# Altium footprint library 7-Connectors-9.PcbLib: 41 footprints (part 1 of 3)
Each footprint in its own frame and in the unit in brackets; x right, y up, seen from the top. Pads: shape width x height; smd on the part's side, far side on the other; paste and mask are expansions set on the pad; w line width, h text height; cw(c..) or ccw(c..) is an arc to the next point about the centre after c.
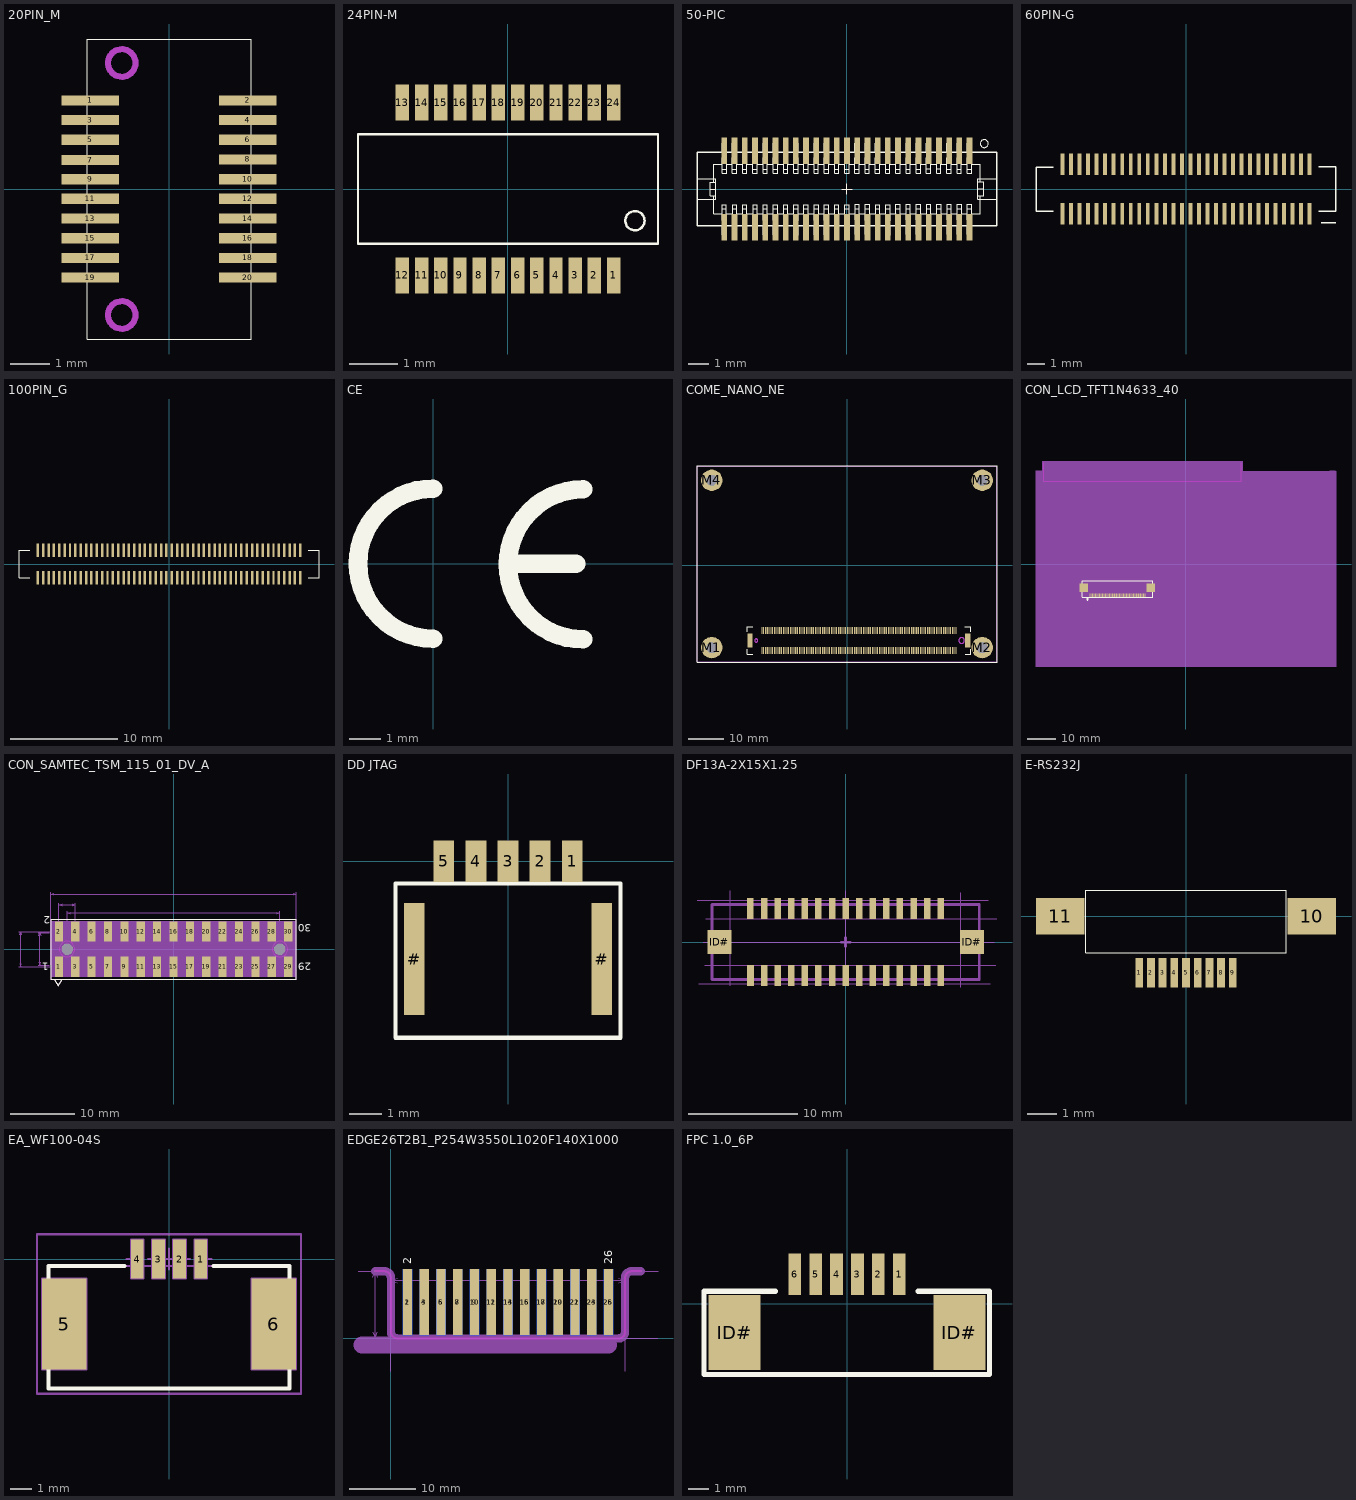
[diagram p0: the footprints below, top view; thin cyan lines are the x and y axes]

## 20PIN_M [mm]
height 6.72
pads (20):
  rect 1.45x0.26 smd: 1(-2,2.25) 2(2,2.25) 3(-2,1.75) 4(2,1.75) 5(-2,1.25) 6(2,1.25) 7(-2,0.737) 8(2,0.75) 9(-2,0.25) 10(2,0.25) 11(-2,-0.25) 12(2,-0.25) 13(-2,-0.75) 14(2,-0.75) 15(-2,-1.25) 16(2,-1.25) 17(-2,-1.75) 18(2,-1.75) 19(-2,-2.25) 20(2,-2.25)
Top Overlay:
  lines w0.025: -2.083,-3.81 2.083,-3.81 2.083,3.81 -2.083,3.81 -2.083,-3.81
Keep-Out Layer:
  circle w0.152: c-1.2,3.2 r0.35
  circle w0.152: c-1.2,-3.2 r0.35
Mechanical 1:
  circle w0.152: c-1.2,3.2 r0.35
  circle w0.152: c-1.2,-3.2 r0.35
3D body "20pin.stp": height 3.5, standoff -0.01, extent -2.88,-3.81 2.88,3.81

## 24PIN-M [mm]
height 6.72
pads (24):
  rect 0.28x0.75 smd: 1(2.2,-1.8) 2(1.8,-1.8) 3(1.4,-1.8) 4(1,-1.8) 5(0.6,-1.8) 6(0.2,-1.8) 7(-0.2,-1.8) 8(-0.6,-1.8) 9(-1,-1.8) 10(-1.4,-1.8) 11(-1.8,-1.8) 12(-2.2,-1.8) 13(-2.2,1.8) 14(-1.8,1.8) 15(-1.4,1.8) 16(-1,1.8) 17(-0.6,1.8) 18(-0.2,1.8) 19(0.2,1.8) 20(0.6,1.8) 21(1,1.8) 22(1.4,1.8) 23(1.8,1.8) 24(2.2,1.8)
Top Overlay:
  circle w0.051: c2.644,-0.66 r0.201
  lines w0.051: -3.124,-1.143 -3.124,1.143 3.124,1.143 3.124,-1.143 -3.124,-1.143

## 50-PIC [mil]
height 264.57
pads (50):
  rect 11x51 smd mask+2: 1(236.22,73.5) 2(216.54,73.5) 3(196.85,73.5) 4(177.17,73.5) 5(157.48,73.5) 6(137.8,73.5) 7(118.11,73.5) 8(98.43,73.5) 9(78.74,73.5) 10(59.06,73.5) 11(39.37,73.5) 12(19.69,73.5) 13(0,73.5) 14(-19.68,73.5) 15(-39.37,73.5) 16(-59.05,73.5) 17(-78.74,73.5) 18(-98.42,73.5) 19(-118.11,73.5) 20(-137.79,73.5) 21(-157.48,73.5) 22(-177.16,73.5) 23(-196.85,73.5) 24(-216.53,73.5) 25(-236.22,73.5) 26(-236.22,-73.5) 27(-216.53,-73.5) 28(-196.85,-73.5) 29(-177.16,-73.5) 30(-157.48,-73.5) 31(-137.79,-73.5) 32(-118.11,-73.5) 33(-98.42,-73.5) 34(-78.74,-73.5) 35(-59.05,-73.5) 36(-39.37,-73.5) 37(-19.68,-73.5) 38(0,-73.5) 39(19.69,-73.5) 40(39.37,-73.5) 41(59.06,-73.5) 42(78.74,-73.5) 43(98.43,-73.5) 44(118.11,-73.5) 45(137.8,-73.5) 46(157.48,-73.5) 47(177.17,-73.5) 48(196.85,-73.5) 49(216.54,-73.5) 50(236.22,-73.5)
Top Overlay:
  drawing of 491 lines, arcs and shapes, not listed

## 60PIN-G [mil]
height 264.57
pads (60):
  rect 9x50 smd mask+2: 1(285.43,-57.5) 2(265.75,-57.5) 3(246.06,-57.5) 4(226.38,-57.5) 5(206.69,-57.5) 6(187.01,-57.5) 7(167.32,-57.5) 8(147.64,-57.5) 9(127.95,-57.5) 10(108.27,-57.5) 11(88.58,-57.5) 12(68.9,-57.5) 13(49.21,-57.5) 14(29.53,-57.5) 15(9.84,-57.5) 16(-9.84,-57.5) 17(-29.53,-57.5) 18(-49.21,-57.5) 19(-68.9,-57.5) 20(-88.58,-57.5) 21(-108.27,-57.5) 22(-127.95,-57.5) 23(-147.64,-57.5) 24(-167.32,-57.5) 25(-187.01,-57.5) 26(-206.69,-57.5) 27(-226.38,-57.5) 28(-246.06,-57.5) 29(-265.75,-57.5) 30(-285.43,-57.5) 31(-285.43,57.5) 32(-265.75,57.5) 33(-246.06,57.5) 34(-226.38,57.5) 35(-206.69,57.5) 36(-187.01,57.5) 37(-167.32,57.5) 38(-147.64,57.5) 39(-127.95,57.5) 40(-108.27,57.5) 41(-88.58,57.5) 42(-68.9,57.5) 43(-49.21,57.5) 44(-29.53,57.5) 45(-9.84,57.5) 46(9.84,57.5) 47(29.53,57.35) 48(49.21,57.35) 49(68.9,57.5) 50(88.58,57.5) 51(108.27,57.5) 52(127.95,57.5) 53(147.64,57.5) 54(167.32,57.5) 55(187.01,57.5) 56(206.69,57.5) 57(226.38,57.5) 58(246.06,57.5) 59(265.75,57.5) 60(285.43,57.5)
Top Overlay:
  lines w3: -346.81,-51.85 -346.81,50.51 ; -346.54,-51.85 -307.17,-51.85 ; -346.57,50.51 -307.2,50.51 ; 306.61,-51.14 346.22,-51.14 346.22,51.22 306.61,51.22 ; 311.73,-78.11 346.02,-78.11

## 100PIN_G [mm]
height 6.72
pads (100):
  rect 0.229x1.27 smd mask+0.051: 1(12.25,-1.3) 2(11.75,-1.3) 3(11.25,-1.3) 4(10.75,-1.3) 5(10.25,-1.3) 6(9.75,-1.3) 7(9.25,-1.3) 8(8.75,-1.3) 9(8.25,-1.3) 10(7.75,-1.3) 11(7.25,-1.3) 12(6.75,-1.3) 13(6.25,-1.3) 14(5.75,-1.3) 15(5.25,-1.3) 16(4.75,-1.3) 17(4.25,-1.3) 18(3.75,-1.3) 19(3.25,-1.3) 20(2.75,-1.3) 21(2.25,-1.3) 22(1.75,-1.3) 23(1.25,-1.3) 24(0.75,-1.3) 25(0.25,-1.3) 26(-0.25,-1.3) 27(-0.75,-1.3) 28(-1.25,-1.3) 29(-1.75,-1.3) 30(-2.25,-1.3) 31(-2.75,-1.3) 32(-3.25,-1.3) 33(-3.75,-1.3) 34(-4.25,-1.3) 35(-4.75,-1.3) 36(-5.25,-1.3) 37(-5.75,-1.3) 38(-6.25,-1.3) 39(-6.75,-1.3) 40(-7.25,-1.3) 41(-7.75,-1.3) 42(-8.25,-1.3) 43(-8.75,-1.3) 44(-9.25,-1.3) 45(-9.75,-1.3) 46(-10.25,-1.3) 47(-10.75,-1.3) 48(-11.25,-1.3) 49(-11.75,-1.3) 50(-12.25,-1.3) 51(-12.25,1.3) 52(-11.75,1.3) 53(-11.25,1.3) 54(-10.75,1.3) 55(-10.25,1.3) 56(-9.75,1.3) 57(-9.25,1.3) 58(-8.75,1.3) 59(-8.25,1.3) 60(-7.75,1.3) 61(-7.25,1.3) 62(-6.75,1.3) 63(-6.25,1.3) 64(-5.75,1.3) 65(-5.25,1.3) 66(-4.75,1.3) 67(-4.25,1.3) 68(-3.75,1.3) 69(-3.25,1.3) 70(-2.75,1.3) 71(-2.25,1.3) 72(-1.75,1.3) 73(-1.25,1.3) 74(-0.75,1.3) 75(-0.25,1.3) 76(0.25,1.3) 77(0.75,1.3) 78(1.25,1.3) 79(1.75,1.3) 80(2.25,1.3) 81(2.775,1.3) 82(3.25,1.3) 83(3.75,1.3) 84(4.25,1.3) 85(4.75,1.3) 86(5.25,1.3) 87(5.75,1.3) 88(6.25,1.3) 89(6.75,1.3) 90(7.25,1.3) 91(7.75,1.3) 92(8.25,1.3) 93(8.75,1.3) 94(9.25,1.3) 95(9.75,1.3) 96(10.25,1.3) 97(10.75,1.3) 98(11.25,1.3) 99(11.75,1.3) 100(12.25,1.3)
Top Overlay:
  lines w0.076: -14.011,1.298 -13.011,1.298 ; -14,1.3 -14,-1.3 -13,-1.3 ; 13,-1.3 14,-1.3 14,1.3 13,1.3

## CE [mm]
Top Overlay:
  lines w0.6: 0,-2.413 cw(c0,0) 0,2.413 ; 2.53,0 4.6,0 ; 4.826,-2.438 cw(c4.826,-0.025) 4.826,2.388
3D body "ce.stp": height 0.02, standoff 0, extent -2.725,-2.725 4.82,2.725

## COME_NANO_NE [mm]
height 11
pads (226):
  rect 0.3x2 smd mask+0.07: A1(-23.897,-23.899) A2(-23.397,-23.899) A3(-22.897,-23.899) A4(-22.397,-23.899) A5(-21.897,-23.899) A6(-21.397,-23.899) A7(-20.897,-23.899) A8(-20.397,-23.899) A9(-19.897,-23.899) A10(-19.397,-23.899) A11(-18.897,-23.899) A12(-18.397,-23.899) A13(-17.897,-23.899) A14(-17.397,-23.899) A15(-16.897,-23.899) A16(-16.397,-23.899) A17(-15.897,-23.899) A18(-15.397,-23.899) A19(-14.897,-23.899) A20(-14.397,-23.899) A21(-13.897,-23.899) A22(-13.397,-23.899) A23(-12.897,-23.899) A24(-12.397,-23.899) A25(-11.897,-23.899) A26(-11.397,-23.899) A27(-10.897,-23.899) A28(-10.397,-23.899) A29(-9.897,-23.899) A30(-9.397,-23.899) A31(-8.897,-23.899) A32(-8.397,-23.899) A33(-7.897,-23.899) A34(-7.397,-23.899) A35(-6.897,-23.899) A36(-6.397,-23.899) A37(-5.897,-23.899) A38(-5.397,-23.899) A39(-4.897,-23.899) A40(-4.397,-23.899) A41(-3.897,-23.899) A42(-3.397,-23.899) A43(-2.897,-23.899) A44(-2.397,-23.899) A45(-1.897,-23.899) A46(-1.397,-23.899) A47(-0.897,-23.899) A48(-0.397,-23.899) A49(0.103,-23.899) A50(0.603,-23.899) A51(1.103,-23.899) A52(1.603,-23.899) A53(2.103,-23.899) A54(2.603,-23.899) A55(3.103,-23.899) A56(3.603,-23.899) A57(4.103,-23.899) A58(4.603,-23.899) A59(5.103,-23.899) A60(5.603,-23.899) A61(6.103,-23.899) A62(6.603,-23.899) A63(7.103,-23.899) A64(7.603,-23.899) A65(8.103,-23.899) A66(8.603,-23.899) A67(9.103,-23.899) A68(9.603,-23.899) A69(10.103,-23.899) A70(10.603,-23.899) A71(11.103,-23.899) A72(11.603,-23.899) A73(12.103,-23.899) A74(12.603,-23.899) A75(13.103,-23.899) A76(13.603,-23.899) A77(14.103,-23.899) A78(14.603,-23.899) A79(15.103,-23.899) A80(15.603,-23.899) A81(16.103,-23.899) A82(16.603,-23.899) A83(17.103,-23.899) A84(17.603,-23.899) A85(18.103,-23.899) A86(18.603,-23.899) A87(19.103,-23.899) A88(19.603,-23.899) A89(20.103,-23.899) A90(20.603,-23.899) A91(21.103,-23.899) A92(21.603,-23.899) A93(22.103,-23.899) A94(22.603,-23.899) A95(23.103,-23.899) A96(23.603,-23.899) A97(24.103,-23.899) A98(24.603,-23.899) A99(25.103,-23.899) A100(25.603,-23.899) A101(26.103,-23.899) A102(26.603,-23.899) A103(27.103,-23.899) A104(27.603,-23.899) A105(28.103,-23.899) A106(28.603,-23.899) A107(29.103,-23.899) A108(29.603,-23.899) A109(30.103,-23.899) A110(30.603,-23.899) B1(-23.897,-18.3) B2(-23.397,-18.3) B3(-22.897,-18.3) B4(-22.397,-18.3) B5(-21.897,-18.3) B6(-21.397,-18.3) B7(-20.897,-18.3) B8(-20.397,-18.3) B9(-19.897,-18.3) B10(-19.397,-18.3) B11(-18.897,-18.3) B12(-18.397,-18.3) B13(-17.897,-18.3) B14(-17.397,-18.3) B15(-16.897,-18.3) B16(-16.397,-18.3) B17(-15.897,-18.3) B18(-15.397,-18.3) B19(-14.897,-18.3) B20(-14.397,-18.3) B21(-13.897,-18.3) B22(-13.397,-18.3) B23(-12.897,-18.3) B24(-12.397,-18.3) B25(-11.897,-18.3) B26(-11.397,-18.3) B27(-10.897,-18.3) B28(-10.397,-18.3) B29(-9.897,-18.3) B30(-9.397,-18.3) B31(-8.897,-18.3) B32(-8.397,-18.3) B33(-7.897,-18.3) B34(-7.397,-18.3) B35(-6.897,-18.3) B36(-6.397,-18.3) B37(-5.897,-18.3) B38(-5.397,-18.3) B39(-4.897,-18.3) B40(-4.397,-18.3) B41(-3.897,-18.3) B42(-3.397,-18.3) B43(-2.897,-18.3) B44(-2.397,-18.3) B45(-1.897,-18.3) B46(-1.397,-18.3) B47(-0.897,-18.3) B48(-0.397,-18.3) B49(0.103,-18.3) B50(0.603,-18.3) B51(1.103,-18.3) B52(1.603,-18.3) B53(2.103,-18.3) B54(2.603,-18.3) B55(3.103,-18.3) B56(3.603,-18.3) B57(4.103,-18.3) B58(4.603,-18.3) B59(5.103,-18.3) B60(5.603,-18.3) B61(6.103,-18.3) B62(6.603,-18.3) B63(7.103,-18.3) B64(7.603,-18.3) B65(8.103,-18.3) B66(8.603,-18.3) B67(9.103,-18.3) B68(9.603,-18.3) B69(10.103,-18.3) B70(10.603,-18.3) B71(11.103,-18.3) B72(11.603,-18.3) B73(12.103,-18.3) B74(12.603,-18.3) B75(13.103,-18.3) B76(13.603,-18.3) B77(14.103,-18.3) B78(14.603,-18.3) B79(15.103,-18.3) B80(15.603,-18.3) B81(16.103,-18.3) B82(16.603,-18.3) B83(17.103,-18.3) B84(17.603,-18.3) B85(18.103,-18.3) B86(18.603,-18.3) B87(19.103,-18.3) B88(19.603,-18.3) B89(20.103,-18.3) B90(20.603,-18.3) B91(21.103,-18.3) B92(21.603,-18.3) B93(22.103,-18.3) B94(22.603,-18.3) B95(23.103,-18.3) B96(23.603,-18.3) B97(24.103,-18.3) B98(24.603,-18.3) B100(25.603,-18.3) B101(26.103,-18.3) B102(26.603,-18.3) B103(27.103,-18.3) B104(27.603,-18.3) B105(28.103,-18.3) B106(28.603,-18.3) B107(29.103,-18.3) B108(29.603,-18.3) B109(30.103,-18.3) B110(30.603,-18.3)
  rect 0.3x2 smd: B99(25.103,-18.3)
  round 6 hole 3 mask+0.07: M1(-38,-23.101) M2(38,-23.101) M3(38,23.899) M4(-38,23.899)
  rect 1.5x4 smd mask+0.07: P1(-27.25,-21.101) P2(33.95,-21.101)
Top Overlay:
  lines w0.03: -42.139,-27.254 -42.139,28.042 42.139,28.042 42.139,-27.254 -42.139,-27.254
  lines w0.254: -28,-23.6 -28,-24.901 -26.5,-24.901 ; -28,-18.6 -28,-17.326 -27.975,-17.301 -26.5,-17.301 ; 33.2,-24.901 34.7,-24.901 34.7,-23.6 ; 33.2,-17.326 33.225,-17.301 34.7,-17.301 34.7,-18.6
Keep-Out Layer:
  circle w0.1: c32.203,-21.099 r0.8
  circle w0.1: c-25.5,-21.101 r0.45
Mechanical 1:
  circle w0.1: c32.203,-21.099 r0.8
  circle w0.1: c-25.5,-21.101 r0.45
Mechanical 15:
  lines w0.203: -42,-27.101 42,-27.101 42,27.899 -42,27.899 -42,-27.101
3D body "come220z.stp": height 4.45, standoff -0.6, extent -27.547,-24.283 34.253,-18.083
3D body "03-2.stp": height 0.02, standoff 0, extent -24.047,-24.899 -23.747,-22.899
3D body "03-2.stp": height 0.02, standoff 0, extent -23.547,-24.899 -23.247,-22.899
3D body "03-2.stp": height 0.02, standoff 0, extent -23.047,-24.899 -22.747,-22.899
3D body "03-2.stp": height 0.02, standoff 0, extent -22.547,-24.899 -22.247,-22.899
3D body "03-2.stp": height 0.02, standoff 0, extent -22.047,-24.899 -21.747,-22.899
3D body "03-2.stp": height 0.02, standoff 0, extent -21.547,-24.899 -21.247,-22.899
3D body "03-2.stp": height 0.02, standoff 0, extent -21.047,-24.899 -20.747,-22.899
3D body "03-2.stp": height 0.02, standoff 0, extent -20.547,-24.899 -20.247,-22.899
3D body "03-2.stp": height 0.02, standoff 0, extent -20.047,-24.899 -19.747,-22.899
3D body "03-2.stp": height 0.02, standoff 0, extent -19.547,-24.899 -19.247,-22.899
3D body "03-2.stp": height 0.02, standoff 0, extent -19.047,-24.899 -18.747,-22.899
3D body "03-2.stp": height 0.02, standoff 0, extent -18.547,-24.899 -18.247,-22.899
3D body "03-2.stp": height 0.02, standoff 0, extent -18.047,-24.899 -17.747,-22.899
3D body "03-2.stp": height 0.02, standoff 0, extent -17.547,-24.899 -17.247,-22.899
3D body "03-2.stp": height 0.02, standoff 0, extent -17.047,-24.899 -16.747,-22.899
3D body "03-2.stp": height 0.02, standoff 0, extent -16.547,-24.899 -16.247,-22.899
3D body "03-2.stp": height 0.02, standoff 0, extent -16.047,-24.899 -15.747,-22.899
3D body "03-2.stp": height 0.02, standoff 0, extent -15.547,-24.899 -15.247,-22.899
3D body "03-2.stp": height 0.02, standoff 0, extent -15.047,-24.899 -14.747,-22.899
3D body "03-2.stp": height 0.02, standoff 0, extent -14.547,-24.899 -14.247,-22.899
3D body "03-2.stp": height 0.02, standoff 0, extent -14.047,-24.899 -13.747,-22.899
3D body "03-2.stp": height 0.02, standoff 0, extent -13.547,-24.899 -13.247,-22.899
3D body "03-2.stp": height 0.02, standoff 0, extent -13.047,-24.899 -12.747,-22.899
3D body "03-2.stp": height 0.02, standoff 0, extent -12.547,-24.899 -12.247,-22.899
3D body "03-2.stp": height 0.02, standoff 0, extent -12.047,-24.899 -11.747,-22.899
3D body "03-2.stp": height 0.02, standoff 0, extent -11.547,-24.899 -11.247,-22.899
3D body "03-2.stp": height 0.02, standoff 0, extent -11.047,-24.899 -10.747,-22.899
3D body "03-2.stp": height 0.02, standoff 0, extent -10.547,-24.899 -10.247,-22.899
3D body "03-2.stp": height 0.02, standoff 0, extent -10.047,-24.899 -9.747,-22.899
3D body "03-2.stp": height 0.02, standoff 0, extent -9.547,-24.899 -9.247,-22.899
3D body "03-2.stp": height 0.02, standoff 0, extent -9.047,-24.899 -8.747,-22.899
3D body "03-2.stp": height 0.02, standoff 0, extent -8.547,-24.899 -8.247,-22.899
3D body "03-2.stp": height 0.02, standoff 0, extent -8.047,-24.899 -7.747,-22.899
3D body "03-2.stp": height 0.02, standoff 0, extent -7.547,-24.899 -7.247,-22.899
3D body "03-2.stp": height 0.02, standoff 0, extent -7.047,-24.899 -6.747,-22.899
3D body "03-2.stp": height 0.02, standoff 0, extent -6.547,-24.899 -6.247,-22.899
3D body "03-2.stp": height 0.02, standoff 0, extent -6.047,-24.899 -5.747,-22.899
3D body "03-2.stp": height 0.02, standoff 0, extent -5.547,-24.899 -5.247,-22.899
3D body "03-2.stp": height 0.02, standoff 0, extent -5.047,-24.899 -4.747,-22.899
3D body "03-2.stp": height 0.02, standoff 0, extent -4.547,-24.899 -4.247,-22.899
3D body "03-2.stp": height 0.02, standoff 0, extent -4.047,-24.899 -3.747,-22.899
3D body "03-2.stp": height 0.02, standoff 0, extent -3.547,-24.899 -3.247,-22.899
3D body "03-2.stp": height 0.02, standoff 0, extent -3.047,-24.899 -2.747,-22.899
3D body "03-2.stp": height 0.02, standoff 0, extent -2.547,-24.899 -2.247,-22.899
3D body "03-2.stp": height 0.02, standoff 0, extent -2.047,-24.899 -1.747,-22.899
3D body "03-2.stp": height 0.02, standoff 0, extent -1.547,-24.899 -1.247,-22.899
3D body "03-2.stp": height 0.02, standoff 0, extent -1.047,-24.899 -0.747,-22.899
3D body "03-2.stp": height 0.02, standoff 0, extent -0.547,-24.899 -0.247,-22.899
3D body "03-2.stp": height 0.02, standoff 0, extent -0.047,-24.899 0.253,-22.899
3D body "03-2.stp": height 0.02, standoff 0, extent 0.453,-24.899 0.753,-22.899
3D body "03-2.stp": height 0.02, standoff 0, extent 0.953,-24.899 1.253,-22.899
3D body "03-2.stp": height 0.02, standoff 0, extent 1.453,-24.899 1.753,-22.899
3D body "03-2.stp": height 0.02, standoff 0, extent 1.953,-24.899 2.253,-22.899
3D body "03-2.stp": height 0.02, standoff 0, extent 2.453,-24.899 2.753,-22.899
3D body "03-2.stp": height 0.02, standoff 0, extent 2.953,-24.899 3.253,-22.899
3D body "03-2.stp": height 0.02, standoff 0, extent 3.453,-24.899 3.753,-22.899
3D body "03-2.stp": height 0.02, standoff 0, extent 3.953,-24.899 4.253,-22.899
3D body "03-2.stp": height 0.02, standoff 0, extent 4.453,-24.899 4.753,-22.899
3D body "03-2.stp": height 0.02, standoff 0, extent 4.953,-24.899 5.253,-22.899
3D body "03-2.stp": height 0.02, standoff 0, extent 5.453,-24.899 5.753,-22.899
3D body "03-2.stp": height 0.02, standoff 0, extent 5.953,-24.899 6.253,-22.899
3D body "03-2.stp": height 0.02, standoff 0, extent 6.453,-24.899 6.753,-22.899
3D body "03-2.stp": height 0.02, standoff 0, extent 6.953,-24.899 7.253,-22.899
3D body "03-2.stp": height 0.02, standoff 0, extent 7.453,-24.899 7.753,-22.899
3D body "03-2.stp": height 0.02, standoff 0, extent 7.953,-24.899 8.253,-22.899
3D body "03-2.stp": height 0.02, standoff 0, extent 8.453,-24.899 8.753,-22.899
3D body "03-2.stp": height 0.02, standoff 0, extent 8.953,-24.899 9.253,-22.899
3D body "03-2.stp": height 0.02, standoff 0, extent 9.453,-24.899 9.753,-22.899
3D body "03-2.stp": height 0.02, standoff 0, extent 9.953,-24.899 10.253,-22.899
3D body "03-2.stp": height 0.02, standoff 0, extent 10.453,-24.899 10.753,-22.899
3D body "03-2.stp": height 0.02, standoff 0, extent 10.953,-24.899 11.253,-22.899
3D body "03-2.stp": height 0.02, standoff 0, extent 11.453,-24.899 11.753,-22.899
3D body "03-2.stp": height 0.02, standoff 0, extent 11.953,-24.899 12.253,-22.899
3D body "03-2.stp": height 0.02, standoff 0, extent 12.453,-24.899 12.753,-22.899
3D body "03-2.stp": height 0.02, standoff 0, extent 12.953,-24.899 13.253,-22.899
3D body "03-2.stp": height 0.02, standoff 0, extent 13.453,-24.899 13.753,-22.899
3D body "03-2.stp": height 0.02, standoff 0, extent 13.953,-24.899 14.253,-22.899
3D body "03-2.stp": height 0.02, standoff 0, extent 14.453,-24.899 14.753,-22.899
3D body "03-2.stp": height 0.02, standoff 0, extent 14.953,-24.899 15.253,-22.899
3D body "03-2.stp": height 0.02, standoff 0, extent 15.453,-24.899 15.753,-22.899
3D body "03-2.stp": height 0.02, standoff 0, extent 15.953,-24.899 16.253,-22.899
3D body "03-2.stp": height 0.02, standoff 0, extent 16.453,-24.899 16.753,-22.899
3D body "03-2.stp": height 0.02, standoff 0, extent 16.953,-24.899 17.253,-22.899
3D body "03-2.stp": height 0.02, standoff 0, extent 17.453,-24.899 17.753,-22.899
3D body "03-2.stp": height 0.02, standoff 0, extent 17.953,-24.899 18.253,-22.899
3D body "03-2.stp": height 0.02, standoff 0, extent 18.453,-24.899 18.753,-22.899
3D body "03-2.stp": height 0.02, standoff 0, extent 18.953,-24.899 19.253,-22.899
3D body "03-2.stp": height 0.02, standoff 0, extent 19.453,-24.899 19.753,-22.899
3D body "03-2.stp": height 0.02, standoff 0, extent 19.953,-24.899 20.253,-22.899
3D body "03-2.stp": height 0.02, standoff 0, extent 20.453,-24.899 20.753,-22.899
3D body "03-2.stp": height 0.02, standoff 0, extent 20.953,-24.899 21.253,-22.899
3D body "03-2.stp": height 0.02, standoff 0, extent 21.453,-24.899 21.753,-22.899
3D body "03-2.stp": height 0.02, standoff 0, extent 21.953,-24.899 22.253,-22.899
3D body "03-2.stp": height 0.02, standoff 0, extent 22.453,-24.899 22.753,-22.899
3D body "03-2.stp": height 0.02, standoff 0, extent 22.953,-24.899 23.253,-22.899
3D body "03-2.stp": height 0.02, standoff 0, extent 23.453,-24.899 23.753,-22.899
3D body "03-2.stp": height 0.02, standoff 0, extent 23.953,-24.899 24.253,-22.899
3D body "03-2.stp": height 0.02, standoff 0, extent 24.453,-24.899 24.753,-22.899
3D body "03-2.stp": height 0.02, standoff 0, extent 24.953,-24.899 25.253,-22.899
3D body "03-2.stp": height 0.02, standoff 0, extent 25.453,-24.899 25.753,-22.899
3D body "03-2.stp": height 0.02, standoff 0, extent 25.953,-24.899 26.253,-22.899
3D body "03-2.stp": height 0.02, standoff 0, extent 26.453,-24.899 26.753,-22.899
3D body "03-2.stp": height 0.02, standoff 0, extent 26.953,-24.899 27.253,-22.899
3D body "03-2.stp": height 0.02, standoff 0, extent 27.453,-24.899 27.753,-22.899
3D body "03-2.stp": height 0.02, standoff 0, extent 27.953,-24.899 28.253,-22.899
3D body "03-2.stp": height 0.02, standoff 0, extent 28.453,-24.899 28.753,-22.899
3D body "03-2.stp": height 0.02, standoff 0, extent 28.953,-24.899 29.253,-22.899
3D body "03-2.stp": height 0.02, standoff 0, extent 29.453,-24.899 29.753,-22.899
3D body "03-2.stp": height 0.02, standoff 0, extent 29.953,-24.899 30.253,-22.899
3D body "03-2.stp": height 0.02, standoff 0, extent 30.453,-24.899 30.753,-22.899
3D body "03-2.stp": height 0.02, standoff 0, extent 30.453,-19.299 30.753,-17.299
3D body "03-2.stp": height 0.02, standoff 0, extent 29.953,-19.299 30.253,-17.299
3D body "03-2.stp": height 0.02, standoff 0, extent 29.453,-19.299 29.753,-17.299
3D body "03-2.stp": height 0.02, standoff 0, extent 28.953,-19.299 29.253,-17.299
3D body "03-2.stp": height 0.02, standoff 0, extent 28.453,-19.299 28.753,-17.299
3D body "03-2.stp": height 0.02, standoff 0, extent 27.953,-19.299 28.253,-17.299
3D body "03-2.stp": height 0.02, standoff 0, extent 27.453,-19.299 27.753,-17.299
3D body "03-2.stp": height 0.02, standoff 0, extent 26.953,-19.299 27.253,-17.299
3D body "03-2.stp": height 0.02, standoff 0, extent 26.453,-19.299 26.753,-17.299
3D body "03-2.stp": height 0.02, standoff 0, extent 25.953,-19.299 26.253,-17.299
3D body "03-2.stp": height 0.02, standoff 0, extent 25.453,-19.299 25.753,-17.299
3D body "03-2.stp": height 0.02, standoff 0, extent 24.953,-19.299 25.253,-17.299
3D body "03-2.stp": height 0.02, standoff 0, extent 24.453,-19.299 24.753,-17.299
3D body "03-2.stp": height 0.02, standoff 0, extent 23.953,-19.299 24.253,-17.299
3D body "03-2.stp": height 0.02, standoff 0, extent 23.453,-19.299 23.753,-17.299
3D body "03-2.stp": height 0.02, standoff 0, extent 22.953,-19.299 23.253,-17.299
3D body "03-2.stp": height 0.02, standoff 0, extent 22.453,-19.299 22.753,-17.299
3D body "03-2.stp": height 0.02, standoff 0, extent 21.953,-19.299 22.253,-17.299
3D body "03-2.stp": height 0.02, standoff 0, extent 21.453,-19.299 21.753,-17.299
3D body "03-2.stp": height 0.02, standoff 0, extent 20.953,-19.299 21.253,-17.299
3D body "03-2.stp": height 0.02, standoff 0, extent 20.453,-19.299 20.753,-17.299
3D body "03-2.stp": height 0.02, standoff 0, extent 19.953,-19.299 20.253,-17.299
3D body "03-2.stp": height 0.02, standoff 0, extent 19.453,-19.299 19.753,-17.299
3D body "03-2.stp": height 0.02, standoff 0, extent 18.953,-19.299 19.253,-17.299
3D body "03-2.stp": height 0.02, standoff 0, extent 18.453,-19.299 18.753,-17.299
3D body "03-2.stp": height 0.02, standoff 0, extent 17.953,-19.299 18.253,-17.299